# Altium footprint library PCB SOM AM625.PcbLib: 62 footprints (part 2 of 4)
Each footprint in its own frame and in the unit in brackets; x right, y up, seen from the top. Pads: shape width x height; smd on the part's side, far side on the other; paste and mask are expansions set on the pad; w line width, h text height; cw(c..) or ccw(c..) is an arc to the next point about the centre after c.
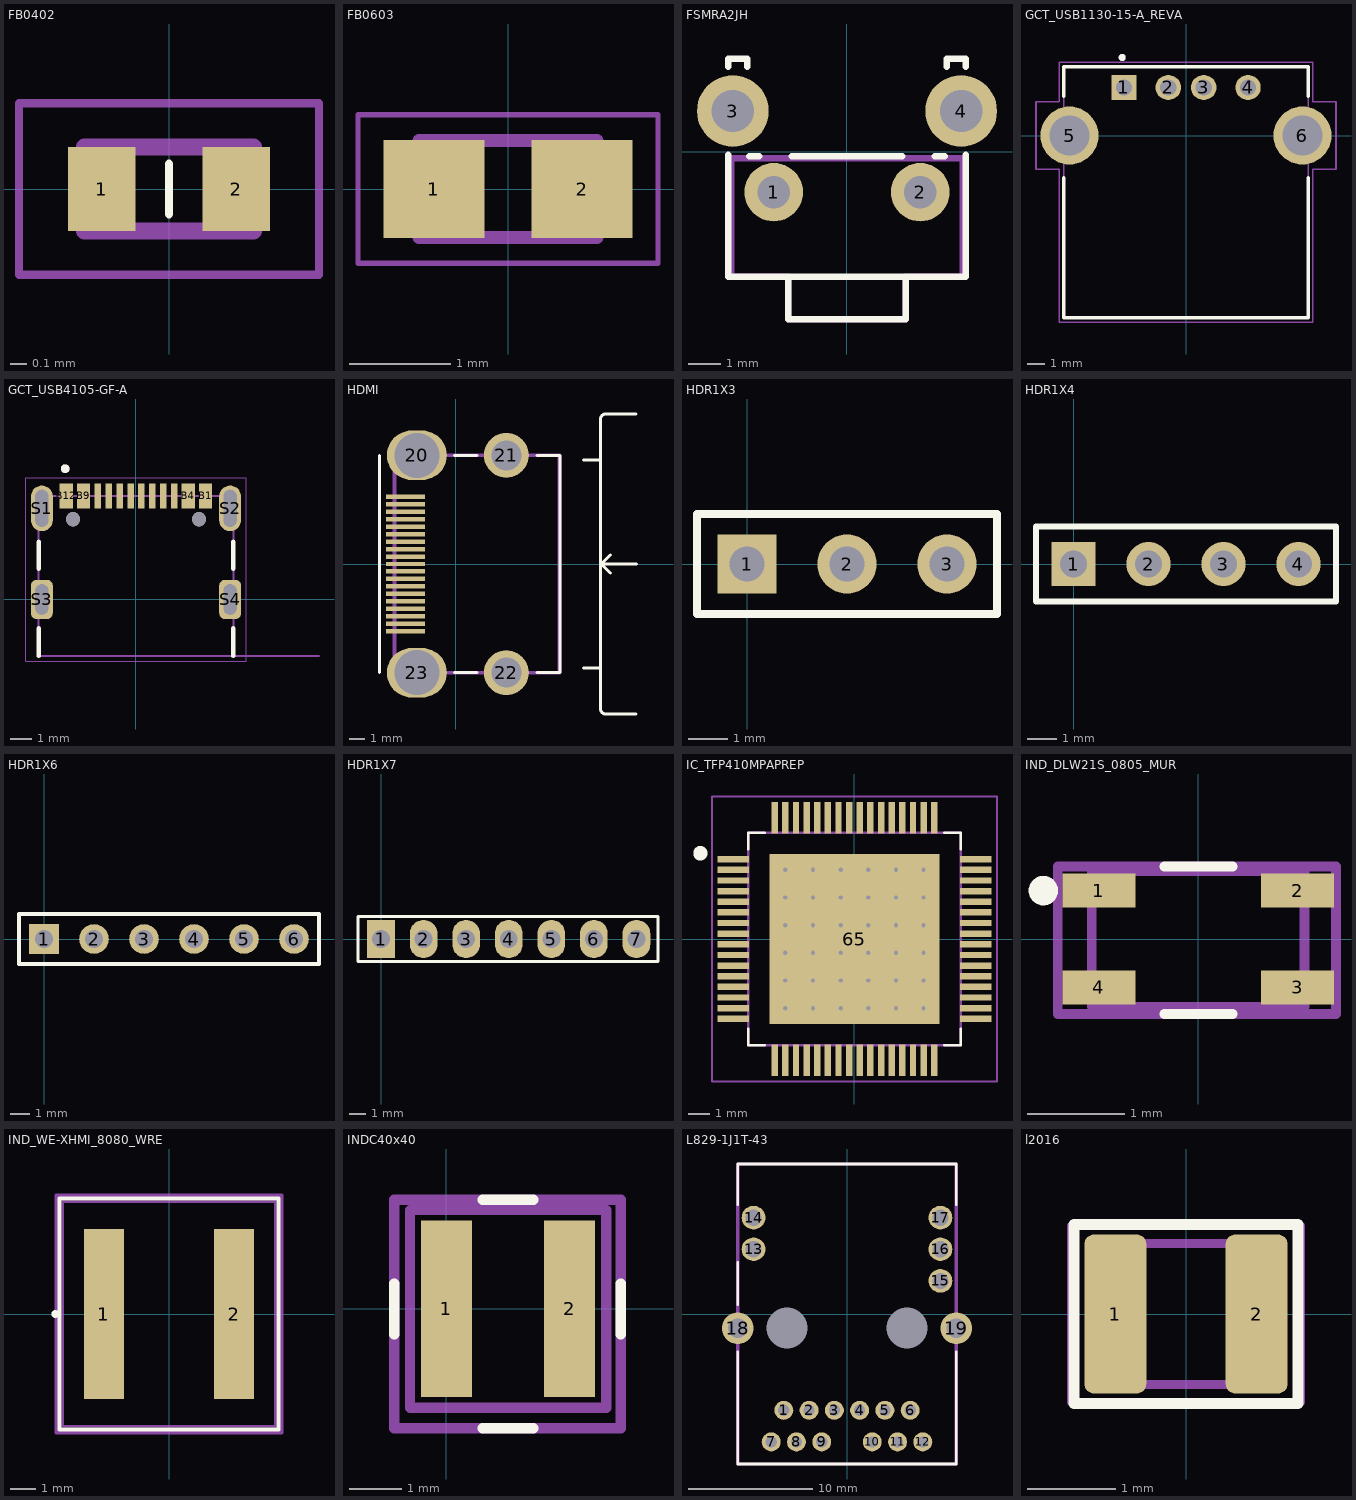
[diagram p1: the footprints below, top view; thin cyan lines are the x and y axes]

## FB0402 [mm]
pads (2):
  rect 0.4x0.5 smd: 1(-0.4,0) 2(0.4,0)
Top Overlay:
  lines w0.05: 0,-0.15 0,0.15
Mechanical 15:
  lines w0.05: -0.889,-0.508 -0.889,0.508 0.889,0.508 0.889,-0.508 -0.889,-0.508
Top ASM:
  lines w0.1: -0.5,-0.25 -0.5,0.25 0.5,0.25 0.5,-0.25 -0.5,-0.25
3D body "BLM15PX121SN1D.stp": height 0.5, standoff 0, extent -0.5,-0.25 0.5,0.25

## FB0603 [mm]
pads (2):
  rect 1x0.97 smd: 1(-0.735,0) 2(0.735,0)
Mechanical 13:
  lines w0.127: -0.88,-0.48 0.88,-0.48 0.88,0.48 -0.88,0.48 -0.88,-0.48
Mechanical 15:
  lines w0.05: -1.485,-0.735 1.485,-0.735 1.485,0.735 -1.485,0.735 -1.485,-0.735
3D body "BLM18RK601SN1D.step": height 0.8, standoff 0, extent -0.8,-0.475 0.8,0.475

## FSMRA2JH [mm] "Creator MM"
height 7.01
pads (4):
  round 1.8 hole 1: 1(-2.25,-1.245) 2(2.25,-1.245)
  round 2.2 hole 1.3: 3(-3.505,1.245) 4(3.505,1.245)
Top Overlay:
  lines w0.2: -3.65,-0.1 -3.65,-3.845 3.65,-3.845 3.65,-0.1 ; -3.65,2.6 -3.65,2.85 -3.055,2.85 -3.055,2.6 ; -3,-0.145 -2.7,-0.145 ; -1.8,-3.845 -1.8,-5.145 1.8,-5.145 1.8,-3.845 ; -1.7,-0.145 1.7,-0.145 ; 2.7,-0.145 3,-0.145 ; 3.055,2.6 3.055,2.85 3.65,2.85 3.65,2.6
Top ASM:
  lines w0.2: -3.55,-3.845 -3.55,-0.2 3.55,-0.2 3.55,-3.845 1.8,-3.845 1.8,-5.145 -1.8,-5.145 -1.8,-3.845 -3.55,-3.845
  text ".Designator" at -1.5,-2.5 h1.2
3D body "c-1825027-5-g1-3d.stp": height 7.05, standoff -3.47, extent -4.204,-5.094 4.204,2.767

## GCT_USB1130-15-A_REVA [mm]
height 7.24
pads (6):
  rect 1.428x1.428 / inner round 1.428 / far side rect 1.428x1.428 hole 0.92: 1(-3.5,2.71)
  round 1.428 hole 0.92: 2(-1,2.71) 3(1,2.71) 4(3.5,2.71)
  round 3.276 hole 2.26: 5(-6.57,0) 6(6.57,0)
Top Overlay:
  circle w0.2: c-3.6,4.4 r0.1
  lines w0.2: -6.9,-2.37 -6.9,-10.28 6.9,-10.28 6.9,-2.37 ; -6.9,2.22 -6.9,3.88 6.9,3.88 6.9,2.22
Top CMT:
  lines w0.1: -8.46,-1.9 -7.15,-1.9 -7.15,-10.53 7.15,-10.53 7.15,-1.9 8.46,-1.9 8.46,1.9 7.15,1.9 7.15,4.13 -7.15,4.13 -7.15,1.9 -8.46,1.9 -8.46,-1.9
Top ASM:
  circle w0.2: c-3.6,4.4 r0.1
  lines w0.1: -6.9,-10.28 -6.9,3.88 6.9,3.88 6.9,-10.28 -6.9,-10.28
3D body "step_temp.STEP": height 6.99, standoff -3.22, extent -7.799,-10.28 7.799,3.88

## GCT_USB4105-GF-A [mm]
height 3.31
pads (18):
  rect 0.3x1.15 smd: A5(-1.25,4.755) A6(-0.25,4.755) A7(0.25,4.755) A8(1.25,4.755) B5(1.75,4.755) B6(0.75,4.755) B7(-0.75,4.755) B8(-1.75,4.755)
  rect 0.6x1.15 smd: B1(3.2,4.755) B4(2.4,4.755) B9(-2.4,4.755) B12(-3.2,4.755)
  oval 1x2.1 hole 0.6 slot 1.7 at 90 deg: S1(-4.32,4.18) S2(4.32,4.18)
  rrect50% 1x1.8 hole 0.6 slot 1.4 at 90 deg: S3(-4.32,0) S4(4.32,0)
  round 0.65 hole 0.65 unplated: ""(-2.89,3.68) ""(2.89,3.68)
Top Overlay:
  circle w0.2: c-3.25,6 r0.1
  lines w0.2: -4.47,-2.6 -4.47,-1.32 ; -4.47,1.4 -4.47,2.65 ; 4.47,-2.6 4.47,-1.32 ; 4.47,1.4 4.47,2.65
Mechanical 13:
  circle w0.2: c-3.25,6 r0.1
  lines w0.1: 8.4,-2.6 4.47,-2.6 ; 4.47,-2.6 -4.47,-2.6 -4.47,4.75 4.47,4.75 4.47,-2.6
  text "PCB EDGE" at 5.4,-2.5 h0.41
Mechanical 15:
  lines w0.05: -5.07,-2.85 5.07,-2.85 5.07,5.58 -5.07,5.58 -5.07,-2.85
3D body "step_temp.STEP": height 3.31, standoff -1.1, extent -4.47,-2.6 4.47,5.11

## HDMI [mm]
pads (23):
  rect 2.6x0.3 smd mask+0.025: 1(-3.36,4.5) 2(-3.36,4) 3(-3.36,3.5) 4(-3.36,3) 5(-3.36,2.5) 6(-3.36,2) 7(-3.36,1.5) 8(-3.36,1) 9(-3.36,0.5) 10(-3.36,0) 11(-3.36,-0.5) 12(-3.36,-1) 13(-3.36,-1.5) 14(-3.36,-2) 15(-3.36,-2.5) 16(-3.36,-3) 17(-3.36,-3.5) 18(-3.36,-4) 19(-3.36,-4.5)
  oval 4x3.3 hole 3: 20(-2.6,7.25) 23(-2.6,-7.25)
  round 3 hole 2: 21(3.36,7.25) 22(3.36,-7.25)
Top Overlay:
  lines w0.2: -5.1,-7.25 -5.1,7.25 ; -0.1,-7.25 1.4,-7.25 ; -0.1,7.25 1.4,7.25 ; 5.4,-7.25 6.9,-7.25 6.95,-7.2 6.95,7.25 ; 5.4,7.25 6.9,7.25 ; 8.5,-6.95 9.65,-6.95 ; 8.5,6.95 9.65,6.95 ; 9.95,10 12,10 ; 10,10 ccw(c9.975,9.675) 9.65,9.7 9.65,-9.7 ccw(c9.975,-9.675) 10,-10 12,-10 ; 10.3,-0.6 9.7,0 ; 10.3,0.6 9.7,0 ; 12.05,0 9.7,0
Mechanical 1:
  text "NOTE: Holes are big and connector" at -6.5,12 h0.5
  text "doesnt fit on one place. Bottom" at -6.5,10.8 h0.5
  text "plastic may go over the board edge" at -6.6,9.6 h0.5
Top ASM:
  lines w0.254: -4.1,-7.25 -4.1,7.25 6.9,7.25 6.9,-7.25 -4.1,-7.25
  text ".Designator" at 0.5,2.3 h1.52
3D body "471510001.stp": height 6.28, standoff -2.1, extent -4.2,-7.5 7.95,7.5

## HDR1X3 [mm] "Connector; Header; 3 Position"
height 1.35
pads (3):
  rect 1.5x1.5 hole 0.9: 1(0,0)
  round 1.5 hole 0.9: 2(2.54,0) 3(5.08,0)
Top Overlay:
  lines w0.2: -1.27,-1.27 -1.27,1.27 ; -1.27,-1.27 6.35,-1.27 6.35,1.27 -1.27,1.27 ; -1.27,-1.27 -1.27,1.27
3D body: height 1.5, standoff 0, extent -1.27,-1.27 1.27,1.27
3D body: height 7, standoff -1, extent -0.406,-0.406 0.39,0.392
3D body: height 1.5, standoff 0, extent 1.27,-1.27 3.81,1.27
3D body: height 7, standoff -1, extent 2.134,-0.406 2.93,0.392
3D body: height 1.5, standoff 0, extent 3.81,-1.27 6.35,1.27
3D body: height 7, standoff -1, extent 4.674,-0.406 5.47,0.392

## HDR1X4 [mm] "Connector; Header; 4 Position"
height 5.08
pads (4):
  rect 1.5x1.5 hole 0.9: 1(0,0)
  round 1.5 hole 0.9: 2(2.54,0) 3(5.08,0) 4(7.62,0)
Top Overlay:
  lines w0.2: -1.27,-1.27 -1.27,1.27 8.89,1.27 8.89,-1.27 -1.27,-1.27
3D body: height 7, standoff -1, extent -0.406,-0.406 0.39,0.392
3D body: height 1.5, standoff 0, extent -1.27,-1.27 1.27,1.27
3D body: height 7, standoff -1, extent 2.134,-0.406 2.93,0.392
3D body: height 1.5, standoff 0, extent 1.27,-1.27 3.81,1.27
3D body: height 7, standoff -1, extent 4.674,-0.406 5.47,0.392
3D body: height 1.5, standoff 0, extent 3.81,-1.27 6.35,1.27
3D body: height 7, standoff -1, extent 7.214,-0.406 8.01,0.392
3D body: height 1.5, standoff 0, extent 6.35,-1.27 8.89,1.27

## HDR1X6 [mm] "Connector; Header; 6 Position"
height 5.08
pads (6):
  rect 1.5x1.5 hole 0.9: 1(0,0)
  round 1.5 hole 0.9: 2(2.54,0) 3(5.08,0) 4(7.62,0) 5(10.16,0) 6(12.7,0)
Top Overlay:
  lines w0.2: -1.27,-1.27 13.97,-1.27 13.97,1.27 -1.27,1.27 -1.27,-1.27
3D body: height 7, standoff -1, extent 12.294,-0.406 13.09,0.392
3D body: height 1.5, standoff 0, extent 11.43,-1.27 13.97,1.27
3D body: height 7, standoff -1, extent -0.406,-0.406 0.39,0.392
3D body: height 1.5, standoff 0, extent -1.27,-1.27 1.27,1.27
3D body: height 7, standoff -1, extent 2.134,-0.406 2.93,0.392
3D body: height 1.5, standoff 0, extent 1.27,-1.27 3.81,1.27
3D body: height 7, standoff -1, extent 4.674,-0.406 5.47,0.392
3D body: height 1.5, standoff 0, extent 3.81,-1.27 6.35,1.27
3D body: height 7, standoff -1, extent 7.214,-0.406 8.01,0.392
3D body: height 1.5, standoff 0, extent 6.35,-1.27 8.89,1.27
3D body: height 7, standoff -1, extent 9.754,-0.406 10.55,0.392
3D body: height 1.5, standoff 0, extent 8.89,-1.27 11.43,1.27

## HDR1X7 [mil] "JP7"
height 200
pads (7):
  rect 65x90 hole 42: 1(0,0)
  oval 65x90 hole 42: 2(100,0) 3(200,0) 4(300,0) 5(400,0) 6(500,0) 7(600,0)
Top Overlay:
  lines w7: -54.13,-53.15 -54.13,53.15 650.59,53.15 650.59,-53.15 -54.13,-53.15
3D body "JP1-7.stp": height 323.44, standoff -117.51, extent -50,-49.22 646.06,49.21

## IC_TFP410MPAPREP [mm]
pads (101):
  rect 1.5x0.3 smd mask+0: 1(-5.7,3.75) 2(-5.7,3.25) 3(-5.7,2.75) 4(-5.7,2.25) 5(-5.7,1.75) 6(-5.7,1.25) 7(-5.7,0.75) 8(-5.7,0.25) 9(-5.7,-0.25) 10(-5.7,-0.75) 11(-5.7,-1.25) 12(-5.7,-1.75) 13(-5.7,-2.25) 14(-5.7,-2.75) 15(-5.7,-3.25) 16(-5.7,-3.75) 33(5.7,-3.75) 34(5.7,-3.25) 35(5.7,-2.75) 36(5.7,-2.25) 37(5.7,-1.75) 38(5.7,-1.25) 39(5.7,-0.75) 40(5.7,-0.25) 41(5.7,0.25) 42(5.7,0.75) 43(5.7,1.25) 44(5.7,1.75) 45(5.7,2.25) 46(5.7,2.75) 47(5.7,3.25) 48(5.7,3.75)
  rect 0.3x1.5 smd mask+0: 17(-3.75,-5.7) 18(-3.25,-5.7) 19(-2.75,-5.7) 20(-2.25,-5.7) 21(-1.75,-5.7) 22(-1.25,-5.7) 23(-0.75,-5.7) 24(-0.25,-5.7) 25(0.25,-5.7) 26(0.75,-5.7) 27(1.25,-5.7) 28(1.75,-5.7) 29(2.25,-5.7) 30(2.75,-5.7) 31(3.25,-5.7) 32(3.75,-5.7) 49(3.75,5.7) 50(3.25,5.7) 51(2.75,5.7) 52(2.25,5.7) 53(1.75,5.7) 54(1.25,5.7) 55(0.75,5.7) 56(0.25,5.7) 57(-0.25,5.7) 58(-0.75,5.7) 59(-1.25,5.7) 60(-1.75,5.7) 61(-2.25,5.7) 62(-2.75,5.7) 63(-3.25,5.7) 64(-3.75,5.7)
  rect 8x8 smd paste-5 mask+0: 65(0,0)
  round 0.4 hole 0.2 mask+0: 66(-3.25,3.25) 67(-1.95,3.25) 68(-0.65,3.25) 69(0.65,3.25) 70(1.95,3.25) 71(3.25,3.25) 72(-3.25,1.95) 73(-1.95,1.95) 74(-0.65,1.95) 75(0.65,1.95) 76(1.95,1.95) 77(3.25,1.95) 78(-3.25,0.65) 79(-1.95,0.65) 80(-0.65,0.65) 81(0.65,0.65) 82(1.95,0.65) 83(3.25,0.65) 84(-3.25,-0.65) 85(-1.95,-0.65) 86(-0.65,-0.65) 87(0.65,-0.65) 88(1.95,-0.65) 89(3.25,-0.65) 90(-3.25,-1.95) 91(-1.95,-1.95) 92(-0.65,-1.95) 93(0.65,-1.95) 94(1.95,-1.95) 95(3.25,-1.95) 96(-3.25,-3.25) 97(-1.95,-3.25) 98(-0.65,-3.25) 99(0.65,-3.25) 100(1.95,-3.25) 101(3.25,-3.25)
Top Overlay:
  circle w0.35: c-7.24,4.03 r0.163
  lines w0.127: -5,-4.22 -5,-5 -4.22,-5 ; -5,4.22 -5,5 -4.22,5 ; 4.22,-5 5,-5 5,-4.22 ; 4.22,5 5,5 5,4.22
Top Paste:
  region: 2.5,-2.5 -2.5,-2.5 -2.5,2.5 2.5,2.5
Top Solder:
  drawing of 65 lines, arcs and shapes, not listed
Mechanical 13:
  circle w0.2: c-7.24,4.03 r0.163
Top CMT:
  lines w0.1: -6.7,-6.7 -6.7,6.7 6.7,6.7 6.7,-6.7 -6.7,-6.7
Top ASM:
  lines w0.127: -5,-5 -5,5 5,5 5,-5 -5,-5
3D body "TFP410MPAPREP.step": height 1.2, standoff 0, extent -6,-6 6,6

## IND_DLW21S_0805_MUR [mm]
pads (4):
  rect 0.755x0.349 smd paste+0 mask+0: 1(-1.027,0.5) 2(1.027,0.5) 3(1.027,-0.5) 4(-1.027,-0.5)
Top Overlay:
  circle w0.152: c-1.6,0.5 r0.076
  lines w0.1: -0.35,-0.775 0.358,-0.775 ; -0.35,0.75 0.358,0.75
Top CMT:
  lines w0.1: -1.45,-0.775 -1.45,0.75 1.425,0.75 1.425,-0.775 -1.45,-0.775
  text ".Comment" at -0.984,-0.253 h0.6
Top ASM:
  lines w0.1: -1.1,-0.7 -1.1,0.7 1.1,0.7 1.1,-0.7 -1.1,-0.7
  text "'.Designator'" at -1.584,-0.253 h0.6
3D body "IND_DLW21S_0805_MUR.step": height 1.4, standoff 0, extent -1.1,-0.7 1.1,0.7

## IND_WE-XHMI_8080_WRE [mil]
pads (2):
  rect 63x268 smd paste+0 mask+0: 1(-102.5,0) 2(102.5,0)
Top Overlay:
  circle w6: c-179.5,0 r3
  lines w6: -172.5,-182 -172.5,182 172.5,182 172.5,-182 -172.5,-182
Mechanical 15:
  lines w6: -177.5,-187 177.5,-187 177.5,-144 177.5,144 177.5,187 -177.5,187 -177.5,144 -177.5,-144 -177.5,-187
Top ASM:
  lines w3.94: -167.5,-177 -167.5,177 167.5,177 167.5,-177 -167.5,-177
3D body "IND_WE-XHMI_8080_WRE.step": height 283.11, standoff 0, extent -167.48,-177.01 167.48,177.01

## INDC40x40 [mm] "Chip Inductor, 2-Leads, Body 40x40mm, IPC High Density"
height 0.55
pads (2):
  rect 0.98x3.4 smd: 1(0,0) 2(2.37,0)
Top Overlay:
  lines w0.2: -1,-0.487 -1,0.487 ; 0.7,-2.3 1.675,-2.3 ; 0.7,2.1 1.675,2.1 ; 3.35,-0.487 3.35,0.487
Top CMT:
  lines w0.2: -0.7,-1.9 -0.7,1.9 3.075,1.9 3.075,-1.9 -0.7,-1.9
  text ".Comment" at -0.1,-0.3 h0.6
Top ASM:
  lines w0.2: -1,-2.3 -1,2.1 3.35,2.1 3.35,-2.3 -1,-2.3
  text "'.Designator'" at -0.7,-0.3 h0.6
3D body "Coilcraft-XFL4015.step": height 1.5, standoff -0.1, extent -0.95,-2.225 3.35,2.075

## L829-1J1T-43 [mil]
pads (21):
  round 60 hole 35.43: 1(-200,-305) 2(-120,-305) 3(-40,-305) 4(40,-305) 5(120,-305) 6(200,-305) 7(-240,-405) 8(-160,-405) 9(-80,-405) 10(80,-405) 11(160,-405) 12(240,-405)
  round 75 hole 51.18: 13(-296,205) 14(-296,305) 15(296,105) 16(296,205) 17(296,305)
  round 100 hole 63: 18(-346,-45) 19(346,-45)
  round 0 hole 129.92: ""(-190,-45) ""(190,-45)
Top Overlay:
  lines w8: -346,-120 -346,-475 346,-475 346,-120 ; -346,30 -346,164 ; -346,346 -346,475 346,475 346,346
Top ASM:
  lines w10: -346,-475 -346,475 346,475 346,-475 -346,-475
  text ".Designator" at -55.12,-177.17 h60
3D body "l829-1j1t-43.stp": height 493.65, standoff -150.89, extent -400.54,-471.86 400.54,494.49

## l2016 [mil]
pads (2):
  rrect29% 27.56x70.86 smd: 1(-31.5,0) 2(31.5,0)
Top Overlay:
  lines w5: -50,-40 50,-40 50,40 -50,40 -50,-40
Top CMT:
  lines w3.94: -51.18,-39.37 -51.18,39.37 51.18,39.37 51.18,-39.37 -51.18,-39.37
  text ".Comment" at -46.6,-8.67 h23.62
Bottom CMT:
  lines w1: -50,-40 50,-40 50,40 -50,40 -50,-40
Top ASM:
  lines w3.94: -39.37,-31.5 -39.37,31.5 39.37,31.5 39.37,-31.5 -39.37,-31.5
  text "'.Designator'" at -70.22,-8.67 h23.62
3D body "User Library-CIGT2016.STEP": height 39.37, standoff 0, extent -39.37,-31.5 39.37,31.5